# Altium schematic symbol library LATTICEPLDS_Library.SchLib: 291 symbols (part 29 of 32) (continued)
## LFXP2-30/40-F672 (continued)
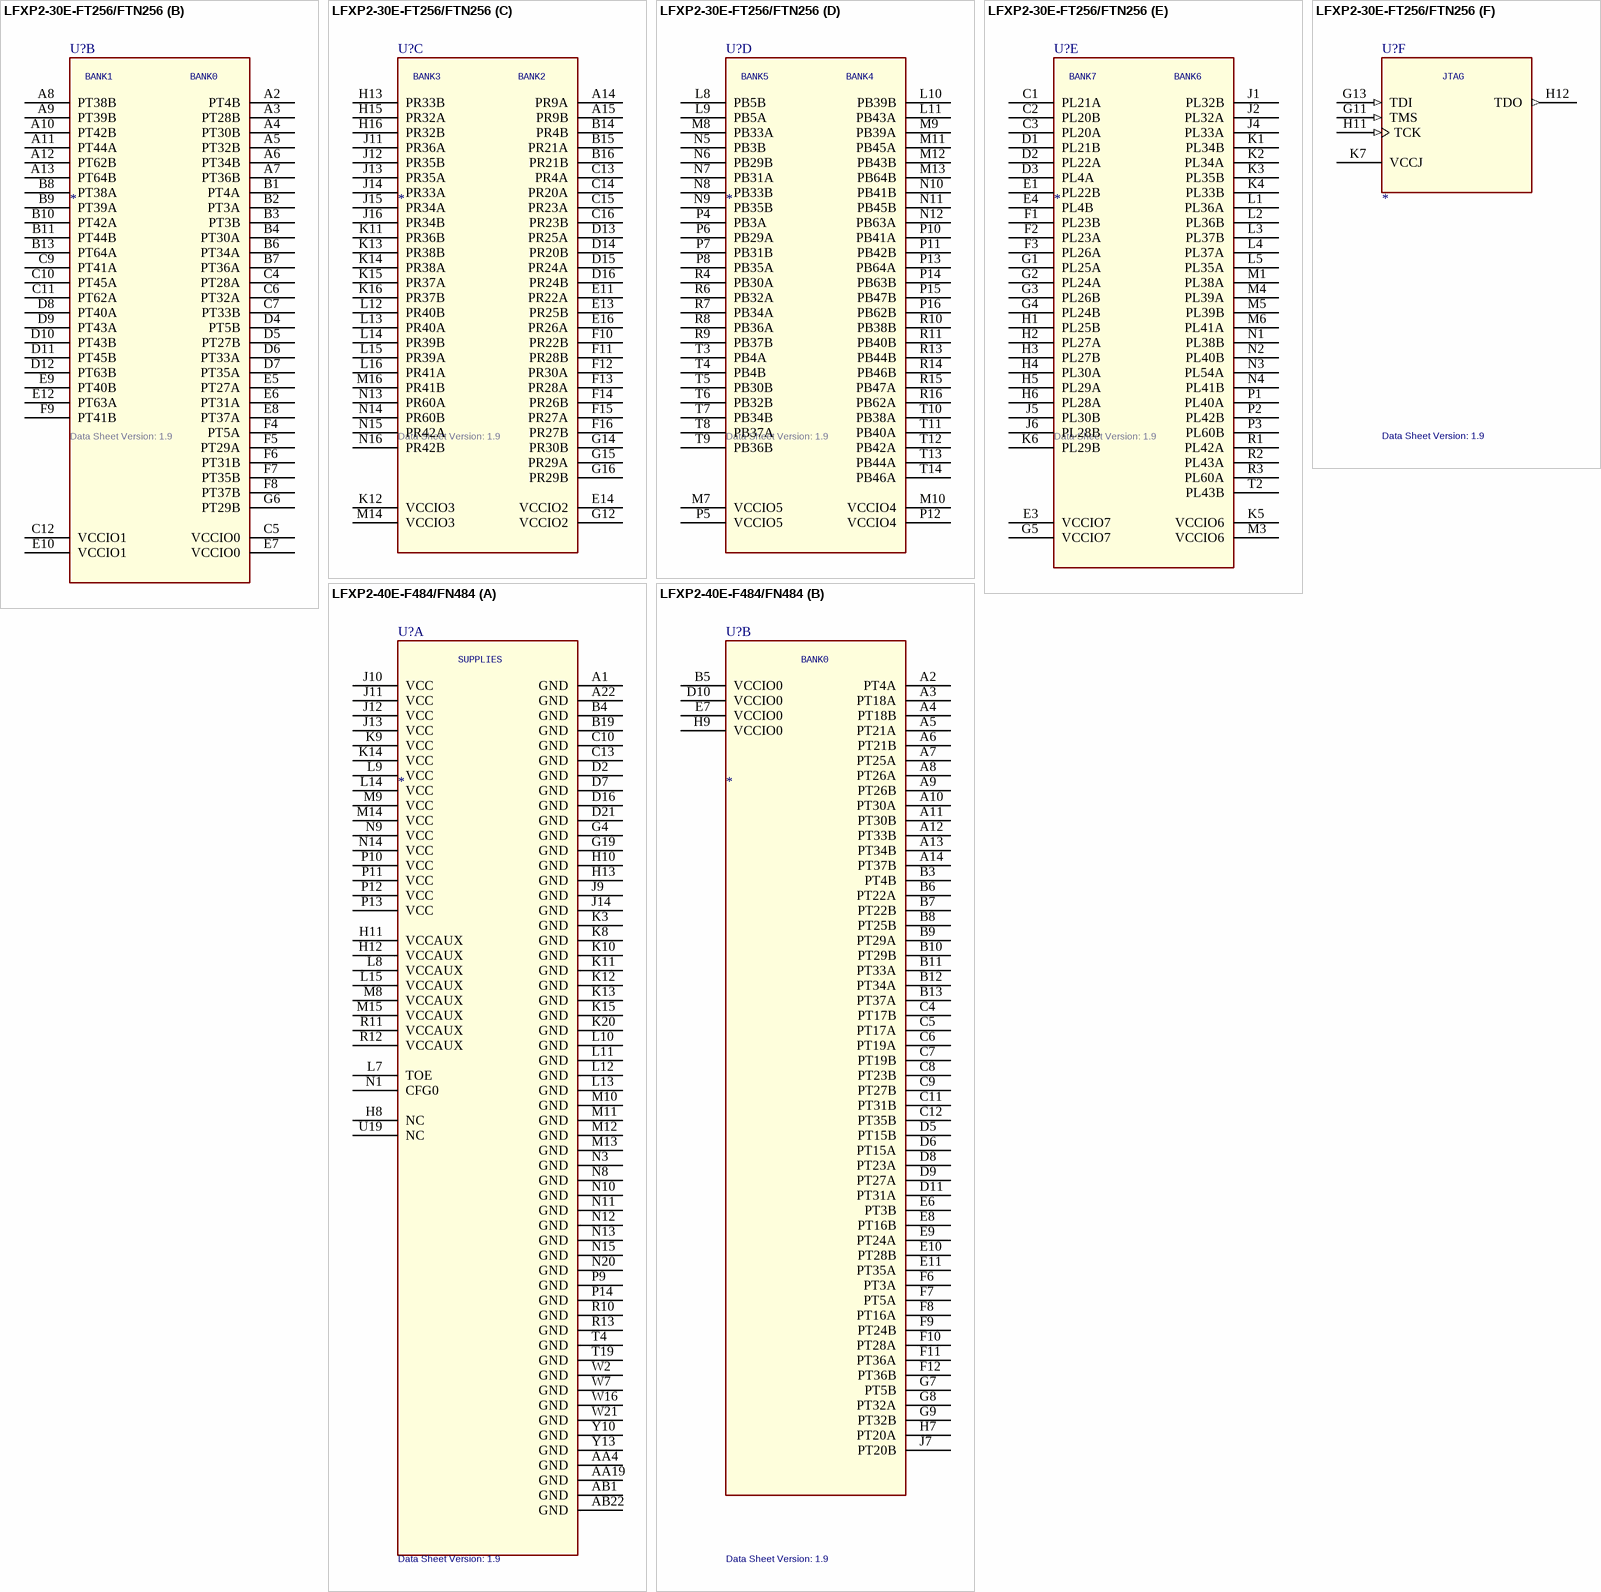
[diagram p262: symbols LFXP2-30E-FT256/FTN256 to LFXP2-40E-F484/FN484]
part A text: Pin Names:; -30            -40; (Pri. DDR)/(Pri. DDR) Secondary
part B text: Pin Names:; -30            -40; (Pri. DDR)/(Pri. DDR) Secondary
part C text: Pin Names:; -30            -40; *=TLVDS; (Pri. DDR)/(Pri. DDR) Secondary
part D text: Pin Names:; *=TLVDS; -30            -40; (Pri. DDR)/(Pri. DDR) Secondary
part E text: Pin Names:; -30            -40; (Pri. DDR)/(Pri. DDR) Secondary
part F text: Pin Names:; -30            -40; (Pri. DDR)/(Pri. DDR) Secondary
part G text: Pin Names:; *=TLVDS; -30            -40; (Pri. DDR)/(Pri. DDR) Secondary
part H text: Pin Names:; *=TLVDS; -30            -40; (Pri. DDR)/(Pri. DDR) Secondary

## LFXP2-30E-FT256/FTN256
designator U?  Data Sheet Version: 1.9
SPLIT_INST: TRUE; SWAP_INFO: (S1+S2+S3+S4+S5+S6)
part A pins: A1 GND (power), A16 GND (power), B5 GND (power), B12 GND (power), C8 GND (power), E2 GND (power), E15 GND (power), G7 VCC (power), G8 VCCAUX (power), G9 VCC (power), G10 NC, H7 VCC (power), H8 GND (power), H9 GND (power), H10 VCCAUX (power), H14 GND (power), J3 GND (power), J7 VCCAUX (power), J8 GND (power), J9 GND (power), J10 VCC (power), K8 VCC (power), K9 VCCAUX (power), K10 VCC (power), L6 TOE, L7 CFG0, M2 GND (power), M15 GND (power), P9 GND (power), R5 GND (power), R12 GND (power), T1 GND (power), T15 NC, T16 GND (power)
part B pins: A2 PT4B, A3 PT28B, A4 PT30B, A5 PT32B, A6 PT34B, A7 PT36B, A8 PT38B, A9 PT39B, A10 PT42B, A11 PT44A, A12 PT62B, A13 PT64B, B1 PT4A, B2 PT3A, B3 PT3B, B4 PT30A, B6 PT34A, B7 PT36A, B8 PT38A, B9 PT39A, B10 PT42A, B11 PT44B, B13 PT64A, C4 PT28A, C5 VCCIO0, C6 PT32A, C7 PT33B, C9 PT41A, C10 PT45A, C11 PT62A, C12 VCCIO1, D4 PT5B, D5 PT27B, D6 PT33A, D7 PT35A, D8 PT40A, D9 PT43A, D10 PT43B, D11 PT45B, D12 PT63B, E5 PT27A, E6 PT31A, E7 VCCIO0, E8 PT37A, E9 PT40B, E10 VCCIO1, E12 PT63A, F4 PT5A, F5 PT29A, F6 PT31B, F7 PT35B, F8 PT37B, F9 PT41B, G6 PT29B
part C pins: A14 PR9A, A15 PR9B, B14 PR4B, B15 PR21A, B16 PR21B, C13 PR4A, C14 PR20A, C15 PR23A, C16 PR23B, D13 PR25A, D14 PR20B, D15 PR24A, D16 PR24B, E11 PR22A, E13 PR25B, E14 VCCIO2, E16 PR26A, F10 PR22B, F11 PR28B, F12 PR30A, F13 PR28A, F14 PR26B, F15 PR27A, F16 PR27B, G12 VCCIO2, G14 PR30B, G15 PR29A, G16 PR29B, H13 PR33B, H15 PR32A, H16 PR32B, J11 PR36A, J12 PR35B, J13 PR35A, J14 PR33A, J15 PR34A, J16 PR34B, K11 PR36B, K12 VCCIO3, K13 PR38B, K14 PR38A, K15 PR37A, K16 PR37B, L12 PR40B, L13 PR40A, L14 PR39B, L15 PR39A, L16 PR41A, M14 VCCIO3, M16 PR41B, N13 PR60A, N14 PR60B, N15 PR42A, N16 PR42B
part D pins: L8 PB5B, L9 PB5A, L10 PB39B, L11 PB43A, M7 VCCIO5, M8 PB33A, M9 PB39A, M10 VCCIO4, M11 PB45A, M12 PB43B, M13 PB64B, N5 PB3B, N6 PB29B, N7 PB31A, N8 PB33B, N9 PB35B, N10 PB41B, N11 PB45B, N12 PB63A, P4 PB3A, P5 VCCIO5, P6 PB29A, P7 PB31B, P8 PB35A, P10 PB41A, P11 PB42B, P12 VCCIO4, P13 PB64A, P14 PB63B, P15 PB47B, P16 PB62B, R4 PB30A, R6 PB32A, R7 PB34A, R8 PB36A, R9 PB37B, R10 PB38B, R11 PB40B, R13 PB44B, R14 PB46B, R15 PB47A, R16 PB62A, T3 PB4A, T4 PB4B, T5 PB30B, T6 PB32B, T7 PB34B, T8 PB37A, T9 PB36B, T10 PB38A, T11 PB40A, T12 PB42A, T13 PB44A, T14 PB46A
part E pins: C1 PL21A, C2 PL20B, C3 PL20A, D1 PL21B, D2 PL22A, D3 PL4A, E1 PL22B, E3 VCCIO7, E4 PL4B, F1 PL23B, F2 PL23A, F3 PL26A, G1 PL25A, G2 PL24A, G3 PL26B, G4 PL24B, G5 VCCIO7, H1 PL25B, H2 PL27A, H3 PL27B, H4 PL30A, H5 PL29A, H6 PL28A, J1 PL32B, J2 PL32A, J4 PL33A, J5 PL30B, J6 PL28B, K1 PL34B, K2 PL34A, K3 PL35B, K4 PL33B, K5 VCCIO6, K6 PL29B, L1 PL36A, L2 PL36B, L3 PL37B, L4 PL37A, L5 PL35A, M1 PL38A, M3 VCCIO6, M4 PL39A, M5 PL39B, M6 PL41A, N1 PL38B, N2 PL40B, N3 PL54A, N4 PL41B, P1 PL40A, P2 PL42B, P3 PL60B, R1 PL42A, R2 PL43A, R3 PL60A, T2 PL43B
part F pins: G11 TMS (in), G13 TDI (in), H11 TCK (in), H12 TDO (out), K7 VCCJ (power)
part A text: SUPPLIES
part B text: BANK1; BANK0
part C text: BANK3; BANK2
part D text: BANK5; BANK4
part E text: BANK7; BANK6
part F text: JTAG

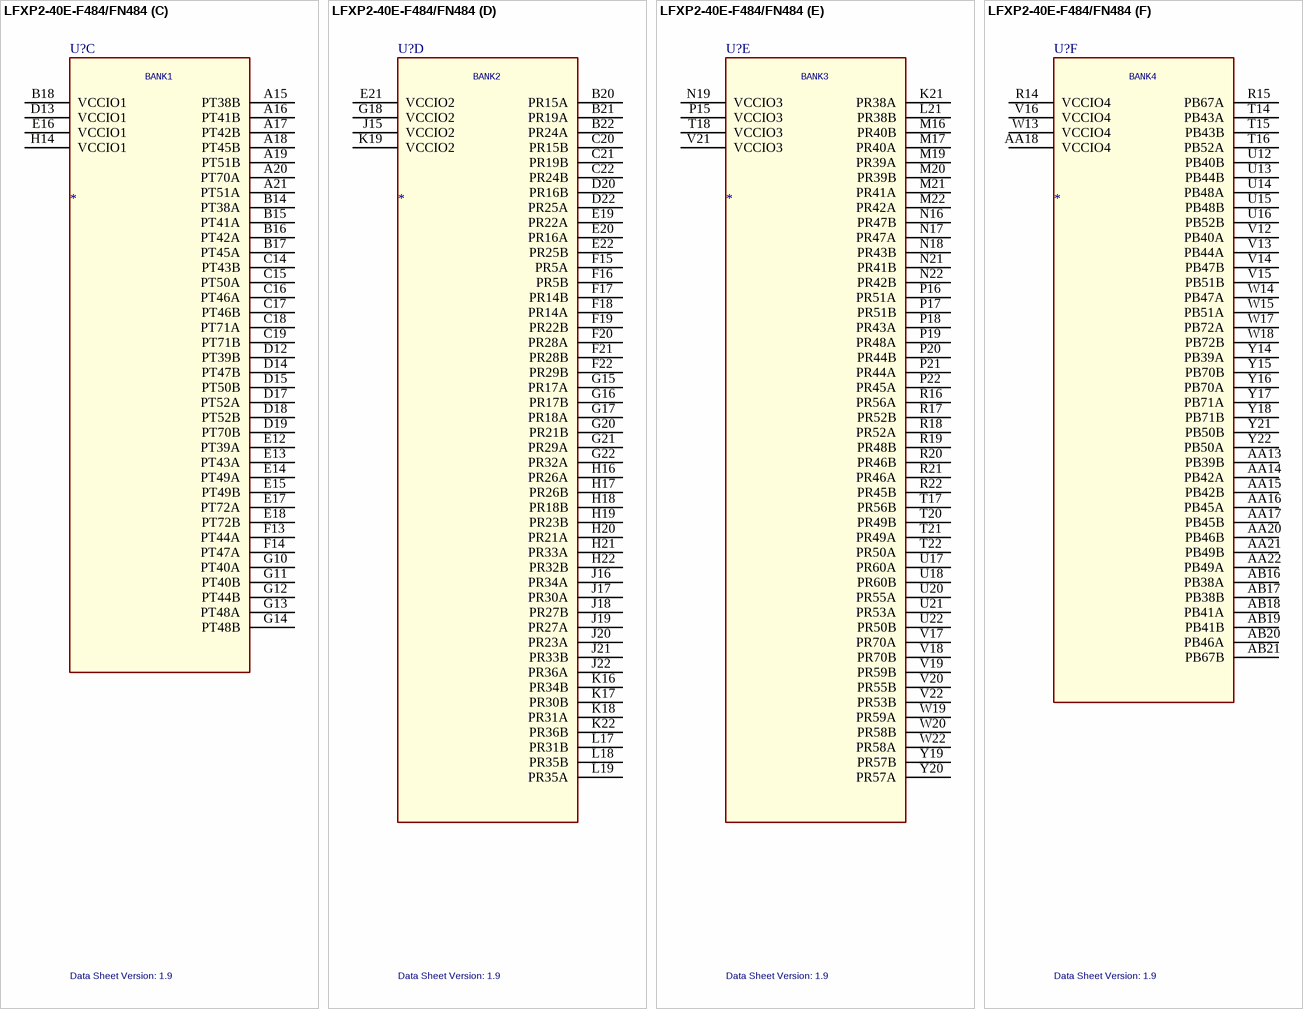
[diagram p263: symbol LFXP2-40E-F484/FN484]

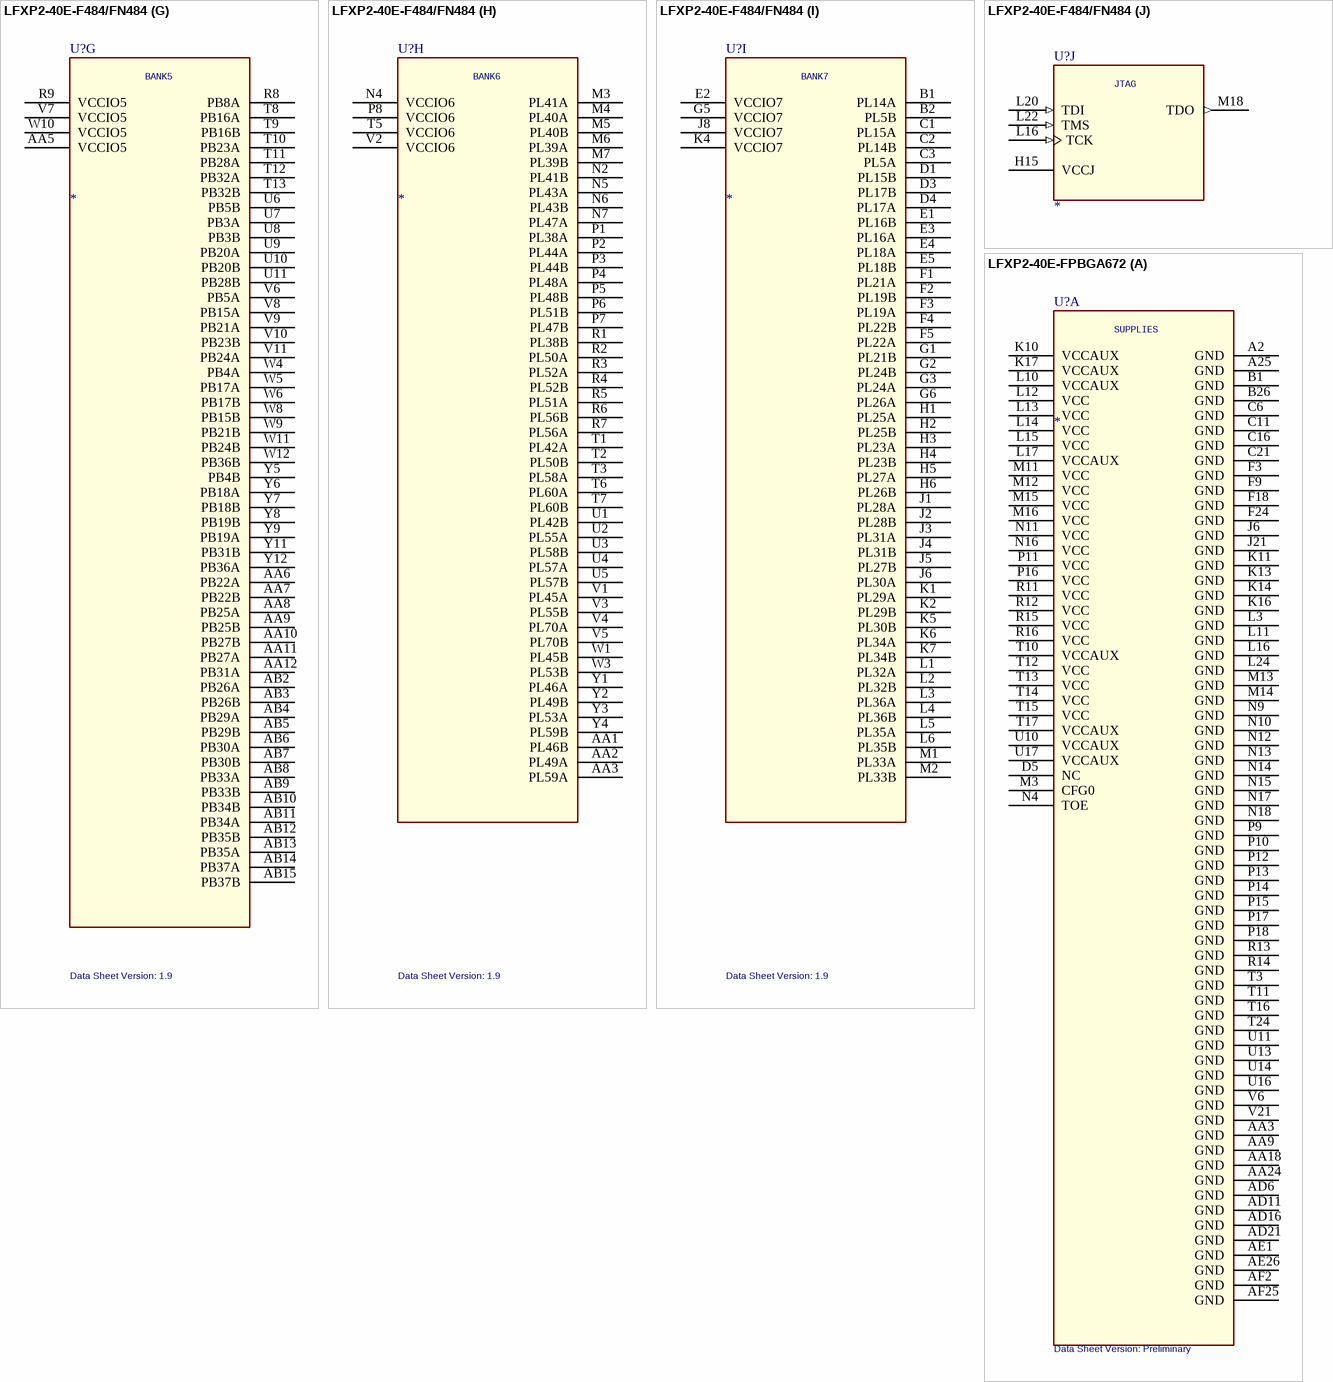
[diagram p264: symbols LFXP2-40E-F484/FN484 to LFXP2-40E-FPBGA672]

## LFXP2-40E-F484/FN484
designator U?  Data Sheet Version: 1.9
SPLIT_INST: TRUE; SWAP_INFO: (S1+S2+S3+S4+S5+S6+S7+S8+S9+S10)
part A pins: A1 GND (power), A22 GND (power), AA4 GND (power), AA19 GND (power), AB1 GND (power), AB22 GND (power), B4 GND (power), B19 GND (power), C10 GND (power), C13 GND (power), D2 GND (power), D7 GND (power), D16 GND (power), D21 GND (power), G4 GND (power), G19 GND (power), H8 NC, H10 GND (power), H11 VCCAUX (power), H12 VCCAUX (power), H13 GND (power), J9 GND (power), J10 VCC (power), J11 VCC (power), J12 VCC (power), J13 VCC (power), J14 GND (power), K3 GND (power), K8 GND (power), K9 VCC (power), K10 GND (power), K11 GND (power), K12 GND (power), K13 GND (power), K14 VCC (power), K15 GND (power), K20 GND (power), L7 TOE, L8 VCCAUX (power), L9 VCC (power), L10 GND (power), L11 GND (power), L12 GND (power), L13 GND (power), L14 VCC (power), L15 VCCAUX (power), M8 VCCAUX (power), M9 VCC (power), M10 GND (power), M11 GND (power), M12 GND (power), M13 GND (power), M14 VCC (power), M15 VCCAUX (power), N1 CFG0, N3 GND (power), N8 GND (power), N9 VCC (power), N10 GND (power), N11 GND (power), N12 GND (power), N13 GND (power), N14 VCC (power), N15 GND (power), N20 GND (power), P9 GND (power), P10 VCC (power), P11 VCC (power), P12 VCC (power), P13 VCC (power), P14 GND (power), R10 GND (power), R11 VCCAUX (power), R12 VCCAUX (power), R13 GND (power), T4 GND (power), T19 GND (power), U19 NC, W2 GND (power), W7 GND (power), W16 GND (power), W21 GND (power), Y10 GND (power), Y13 GND (power)
part B pins: A2 PT4A, A3 PT18A, A4 PT18B, A5 PT21A, A6 PT21B, A7 PT25A, A8 PT26A, A9 PT26B, A10 PT30A, A11 PT30B, A12 PT33B, A13 PT34B, A14 PT37B, B3 PT4B, B5 VCCIO0 (power), B6 PT22A, B7 PT22B, B8 PT25B, B9 PT29A, B10 PT29B, B11 PT33A, B12 PT34A, B13 PT37A, C4 PT17B, C5 PT17A, C6 PT19A, C7 PT19B, C8 PT23B, C9 PT27B, C11 PT31B, C12 PT35B, D5 PT15B, D6 PT15A, D8 PT23A, D9 PT27A, D10 VCCIO0 (power), D11 PT31A, E6 PT3B, E7 VCCIO0 (power), E8 PT16B, E9 PT24A, E10 PT28B, E11 PT35A, F6 PT3A, F7 PT5A, F8 PT16A, F9 PT24B, F10 PT28A, F11 PT36A, F12 PT36B, G7 PT5B, G8 PT32A, G9 PT32B, H7 PT20A, H9 VCCIO0 (power), J7 PT20B
part C pins: A15 PT38B, A16 PT41B, A17 PT42B, A18 PT45B, A19 PT51B, A20 PT70A, A21 PT51A, B14 PT38A, B15 PT41A, B16 PT42A, B17 PT45A, B18 VCCIO1 (power), C14 PT43B, C15 PT50A, C16 PT46A, C17 PT46B, C18 PT71A, C19 PT71B, D12 PT39B, D13 VCCIO1 (power), D14 PT47B, D15 PT50B, D17 PT52A, D18 PT52B, D19 PT70B, E12 PT39A, E13 PT43A, E14 PT49A, E15 PT49B, E16 VCCIO1 (power), E17 PT72A, E18 PT72B, F13 PT44A, F14 PT47A, G10 PT40A, G11 PT40B, G12 PT44B, G13 PT48A, G14 PT48B, H14 VCCIO1 (power)
part D pins: B20 PR15A, B21 PR19A, B22 PR24A, C20 PR15B, C21 PR19B, C22 PR24B, D20 PR16B, D22 PR25A, E19 PR22A, E20 PR16A, E21 VCCIO2 (power), E22 PR25B, F15 PR5A, F16 PR5B, F17 PR14B, F18 PR14A, F19 PR22B, F20 PR28A, F21 PR28B, F22 PR29B, G15 PR17A, G16 PR17B, G17 PR18A, G18 VCCIO2 (power), G20 PR21B, G21 PR29A, G22 PR32A, H16 PR26A, H17 PR26B, H18 PR18B, H19 PR23B, H20 PR21A, H21 PR33A, H22 PR32B, J15 VCCIO2 (power), J16 PR34A, J17 PR30A, J18 PR27B, J19 PR27A, J20 PR23A, J21 PR33B, J22 PR36A, K16 PR34B, K17 PR30B, K18 PR31A, K19 VCCIO2 (power), K22 PR36B, L17 PR31B, L18 PR35B, L19 PR35A
part E pins: K21 PR38A, L21 PR38B, M16 PR40B, M17 PR40A, M19 PR39A, M20 PR39B, M21 PR41A, M22 PR42A, N16 PR47B, N17 PR47A, N18 PR43B, N19 VCCIO3 (power), N21 PR41B, N22 PR42B, P15 VCCIO3 (power), P16 PR51A, P17 PR51B, P18 PR43A, P19 PR48A, P20 PR44B, P21 PR44A, P22 PR45A, R16 PR56A, R17 PR52B, R18 PR52A, R19 PR48B, R20 PR46B, R21 PR46A, R22 PR45B, T17 PR56B, T18 VCCIO3 (power), T20 PR49B, T21 PR49A, T22 PR50A, U17 PR60A, U18 PR60B, U20 PR55A, U21 PR53A, U22 PR50B, V17 PR70A, V18 PR70B, V19 PR59B, V20 PR55B, V21 VCCIO3 (power), V22 PR53B, W19 PR59A, W20 PR58B, W22 PR58A, Y19 PR57B, Y20 PR57A
part F pins: AA13 PB39B, AA14 PB42A, AA15 PB42B, AA16 PB45A, AA17 PB45B, AA18 VCCIO4 (power), AA20 PB46B, AA21 PB49B, AA22 PB49A, AB16 PB38A, AB17 PB38B, AB18 PB41A, AB19 PB41B, AB20 PB46A, AB21 PB67B, R14 VCCIO4 (power), R15 PB67A, T14 PB43A, T15 PB43B, T16 PB52A, U12 PB40B, U13 PB44B, U14 PB48A, U15 PB48B, U16 PB52B, V12 PB40A, V13 PB44A, V14 PB47B, V15 PB51B, V16 VCCIO4 (power), W13 VCCIO4 (power), W14 PB47A, W15 PB51A, W17 PB72A, W18 PB72B, Y14 PB39A, Y15 PB70B, Y16 PB70A, Y17 PB71A, Y18 PB71B, Y21 PB50B, Y22 PB50A
part G pins: AA5 VCCIO5 (power), AA6 PB22A, AA7 PB22B, AA8 PB25A, AA9 PB25B, AA10 PB27B, AA11 PB27A, AA12 PB31A, AB2 PB26A, AB3 PB26B, AB4 PB29A, AB5 PB29B, AB6 PB30A, AB7 PB30B, AB8 PB33A, AB9 PB33B, AB10 PB34B, AB11 PB34A, AB12 PB35B, AB13 PB35A, AB14 PB37A, AB15 PB37B, R8 PB8A, R9 VCCIO5 (power), T8 PB16A, T9 PB16B, T10 PB23A, T11 PB28A, T12 PB32A, T13 PB32B, U6 PB5B, U7 PB3A, U8 PB3B, U9 PB20A, U10 PB20B, U11 PB28B, V6 PB5A, V7 VCCIO5 (power), V8 PB15A, V9 PB21A, V10 PB23B, V11 PB24A, W4 PB4A, W5 PB17A, W6 PB17B, W8 PB15B, W9 PB21B, W10 VCCIO5 (power), W11 PB24B, W12 PB36B, Y5 PB4B, Y6 PB18A, Y7 PB18B, Y8 PB19B, Y9 PB19A, Y11 PB31B, Y12 PB36A
part H pins: AA1 PL46B, AA2 PL49A, AA3 PL59A, M3 PL41A, M4 PL40A, M5 PL40B, M6 PL39A, M7 PL39B, N2 PL41B, N4 VCCIO6 (power), N5 PL43A, N6 PL43B, N7 PL47A, P1 PL38A, P2 PL44A, P3 PL44B, P4 PL48A, P5 PL48B, P6 PL51B, P7 PL47B, P8 VCCIO6 (power), R1 PL38B, R2 PL50A, R3 PL52A, R4 PL52B, R5 PL51A, R6 PL56B, R7 PL56A, T1 PL42A, T2 PL50B, T3 PL58A, T5 VCCIO6 (power), T6 PL60A, T7 PL60B, U1 PL42B, U2 PL55A, U3 PL58B, U4 PL57A, U5 PL57B, V1 PL45A, V2 VCCIO6 (power), V3 PL55B, V4 PL70A, V5 PL70B, W1 PL45B, W3 PL53B, Y1 PL46A, Y2 PL49B, Y3 PL53A, Y4 PL59B
part I pins: B1 PL14A, B2 PL5B, C1 PL15A, C2 PL14B, C3 PL5A, D1 PL15B, D3 PL17B, D4 PL17A, E1 PL16B, E2 VCCIO7 (power), E3 PL16A, E4 PL18A, E5 PL18B, F1 PL21A, F2 PL19B, F3 PL19A, F4 PL22B, F5 PL22A, G1 PL21B, G2 PL24B, G3 PL24A, G5 VCCIO7 (power), G6 PL26A, H1 PL25A, H2 PL25B, H3 PL23A, H4 PL23B, H5 PL27A, H6 PL26B, J1 PL28A, J2 PL28B, J3 PL31A, J4 PL31B, J5 PL27B, J6 PL30A, J8 VCCIO7 (power), K1 PL29A, K2 PL29B, K4 VCCIO7 (power), K5 PL30B, K6 PL34A, K7 PL34B, L1 PL32A, L2 PL32B, L3 PL36A, L4 PL36B, L5 PL35A, L6 PL35B, M1 PL33A, M2 PL33B
part J pins: H15 VCCJ (power), L16 TCK (in), L20 TDI (in), L22 TMS (in), M18 TDO (out)
part A text: SUPPLIES
part B text: BANK0
part C text: BANK1
part D text: BANK2
part E text: BANK3
part F text: BANK4
part G text: BANK5
part H text: BANK6
part I text: BANK7
part J text: JTAG

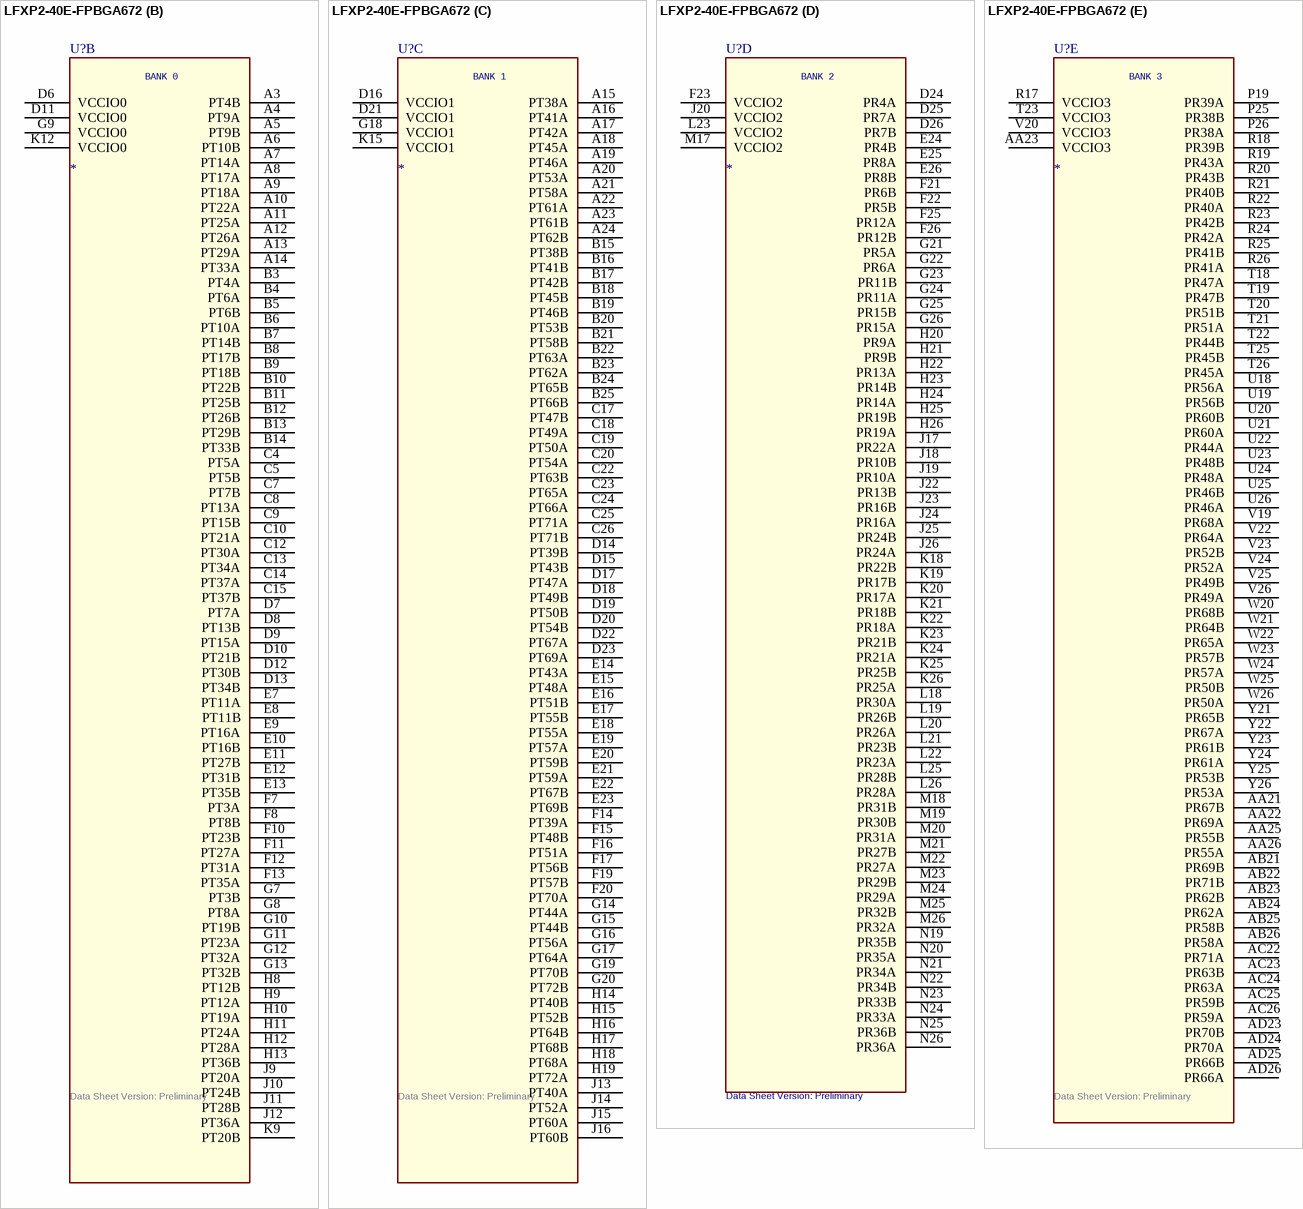
[diagram p265: symbol LFXP2-40E-FPBGA672]

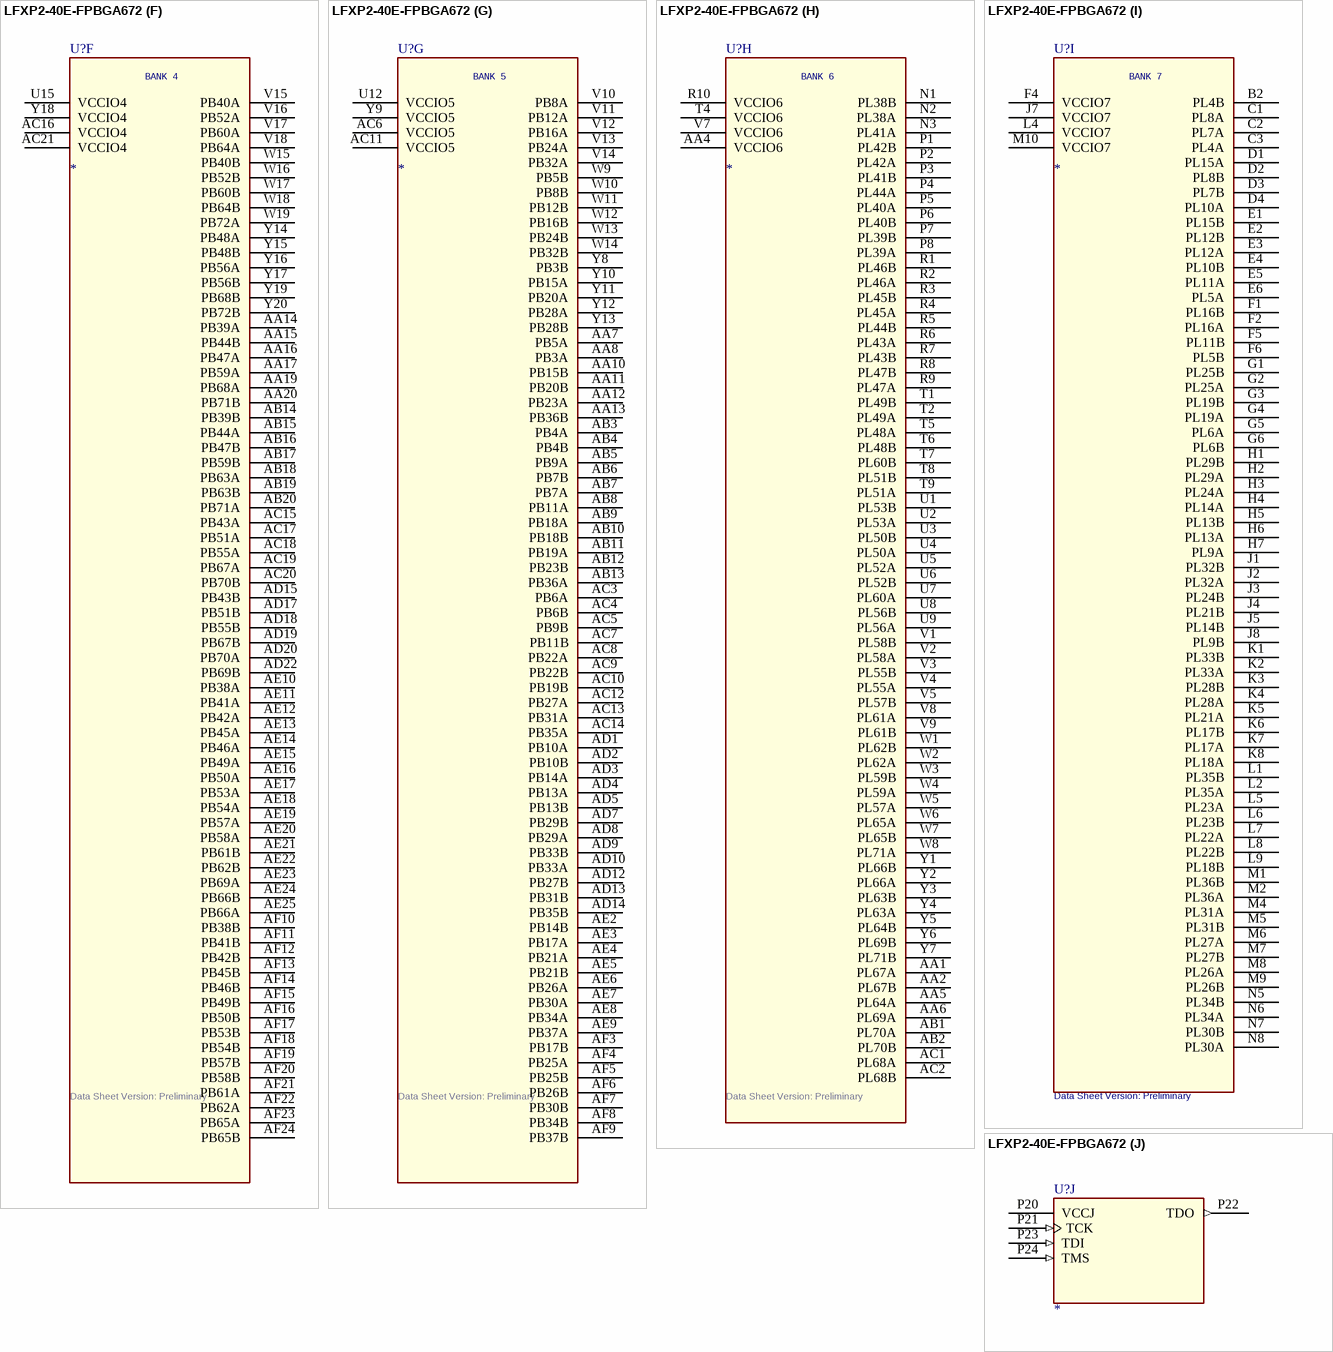
[diagram p266: symbol LFXP2-40E-FPBGA672]
